# Altium footprint library microbuilder.PCBLIB: 422 footprints (part 16 of 27)
Each footprint in its own frame and in the unit in brackets; x right, y up, seen from the top. Pads: shape width x height; smd on the part's side, far side on the other; paste and mask are expansions set on the pad; w line width, h text height; cw(c..) or ccw(c..) is an arc to the next point about the centre after c.
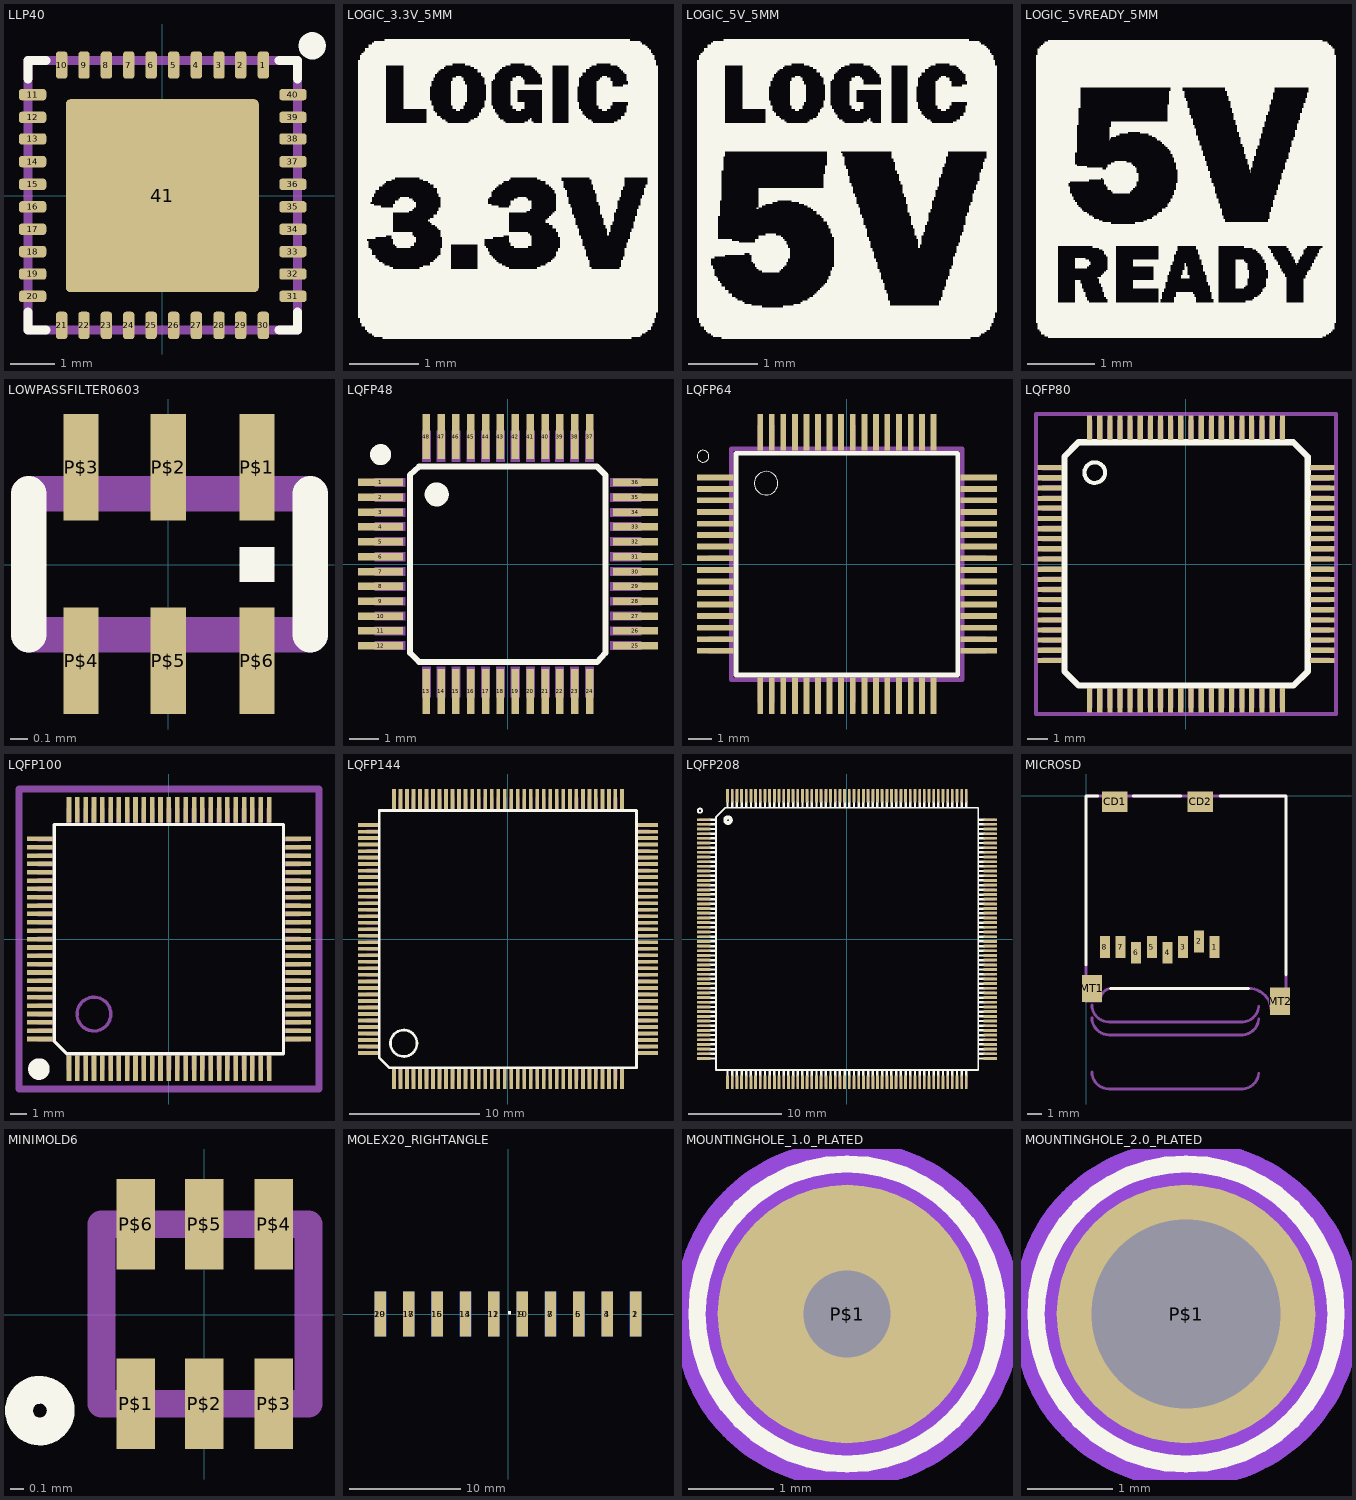
[diagram p15: the footprints below, top view; thin cyan lines are the x and y axes]

## LLP40 [mil]
pads (41):
  rrect50% 10x24 smd: 1(89,115) 2(69,115) 3(50,115) 4(30,115) 5(10,115) 6(-9.84,115) 7(-29.53,115) 8(-49.21,115) 9(-68.9,115) 10(-88.58,115) 21(-88.58,-114.17) 22(-68.9,-114.17) 23(-49.21,-114.17) 24(-29.53,-114.17) 25(-9.84,-114.17) 26(10,-114.17) 27(30,-114.17) 28(50,-114.17) 29(69,-114.17) 30(89,-114.17)
  rrect50% 24x10 smd: 11(-114.17,89) 12(-114.17,69) 13(-114.17,50) 14(-114.17,30) 15(-114.17,10) 16(-114.17,-9.84) 17(-114.17,-29.53) 18(-114.17,-49.21) 19(-114.17,-68.9) 20(-114.17,-88.58) 31(115,-88.58) 32(115,-68.9) 33(115,-49.21) 34(115,-29.53) 35(115,-9.84) 36(115,10) 37(115,30) 38(115,50) 39(115,69) 40(115,89)
  rrect5% 170x170 smd: 41(0,0)
Top Overlay:
  circle w12: c132,132 r6
  lines w8: -118.11,-102.36 -118.11,-118.11 -102.36,-118.11 ; -118.11,103 -118.11,119 -102.36,119 ; 103,-118.11 119,-118.11 119,-102.36 ; 103,119 119,119 119,103
Top Paste:
  rectangle: -78.74,40 -39.37,79
  rectangle: -19.68,40 20,79
  rectangle: 40,40 79,79
  rectangle: 40,-19.68 79,20
  rectangle: -19.68,-19.68 20,20
  rectangle: -78.74,-19.68 -39.37,20
  rectangle: -78.74,-78.74 -39.37,-39.37
  rectangle: -19.68,-78.74 20,-39.37
  rectangle: 40,-78.74 79,-39.37
Mechanical 16:
  lines w8: -118.11,-118.11 -118.11,119 119,119 119,-118.11 -118.11,-118.11

## LOGIC_3.3V_5MM [mil]
Top Overlay:
  drawing of 941 lines, arcs and shapes, not listed

## LOGIC_5V_5MM [mil]
Top Overlay:
  drawing of 975 lines, arcs and shapes, not listed

## LOGIC_5VREADY_5MM [mil]
Top Overlay:
  drawing of 1595 lines, arcs and shapes, not listed

## LOWPASSFILTER0603 [mil]
pads (6):
  rect 8x24 smd: P$1(20,22) P$2(0,22) P$3(-19.68,22) P$4(-19.68,-21.65) P$5(0,-21.65) P$6(20,-21.65)
Top Overlay:
  rectangle: 16,-3.94 24,4
  lines w8: -31.5,-15.75 -31.5,16 ; 32,-15.75 32,16
Mechanical 16:
  lines w5: -31.5,-15.75 -31.5,16 ; 32,-15.75 32,16
  lines w8: -31.5,-15.75 32,-15.75 ; -31.5,16 32,16

## LQFP48 [mil]
pads (48):
  rect 60x10 smd: 1(-169.29,109) 2(-169.29,89) 3(-169.29,69) 4(-169.29,50) 5(-169.29,30) 6(-169.29,10) 7(-169.29,-9.84) 8(-169.29,-29.53) 9(-169.29,-49.21) 10(-169.29,-68.9) 11(-169.29,-88.58) 12(-169.29,-108.27) 25(170,-108.27) 26(170,-88.58) 27(170,-68.9) 28(170,-49.21) 29(170,-29.53) 30(170,-9.84) 31(170,10) 32(170,30) 33(170,50) 34(170,69) 35(170,89) 36(170,109)
  rect 10x60 smd: 13(-108.27,-169.29) 14(-88.58,-169.29) 15(-68.9,-169.29) 16(-49.21,-169.29) 17(-29.53,-169.29) 18(-9.84,-169.29) 19(10,-169.29) 20(30,-169.29) 21(50,-169.29) 22(69,-169.29) 23(89,-169.29) 24(109,-169.29) 37(109,170) 38(89,170) 39(69,170) 40(50,170) 41(30,170) 42(10,170) 43(-9.84,170) 44(-29.53,170) 45(-49.21,170) 46(-68.9,170) 47(-88.58,170) 48(-108.27,170)
Top Overlay:
  circle w16: c-169.29,146 r6
  circle w16: c-94.49,93 r8
  lines w8: -129.92,-118.11 -129.92,119 -118.11,130 119,130 130,119 130,-118.11 119,-129.92 -118.11,-129.92 -129.92,-118.11
Mechanical 16:
  rectangle: -177.16,103 -135.83,115
  rectangle: -177.16,83 -135.83,95
  rectangle: -177.16,63 -135.83,75
  rectangle: -177.16,44 -135.83,56
  rectangle: -177.16,24 -135.83,36
  rectangle: -177.16,4 -135.83,16
  rectangle: -177.16,-15.75 -135.83,-3.93
  rectangle: -177.16,-35.44 -135.83,-23.62
  rectangle: -177.16,-55.12 -135.83,-43.3
  rectangle: -177.16,-74.81 -135.83,-62.99
  rectangle: -177.16,-94.49 -135.83,-82.67
  rectangle: -177.16,-114.18 -135.83,-102.36
  rectangle: -114.18,-177.16 -102.36,-135.83
  rectangle: -94.49,-177.16 -82.67,-135.83
  rectangle: -74.81,-177.16 -62.99,-135.83
  rectangle: -55.12,-177.16 -43.3,-135.83
  rectangle: -35.44,-177.16 -23.62,-135.83
  rectangle: -15.75,-177.16 -3.93,-135.83
  rectangle: 4,-177.16 16,-135.83
  rectangle: 24,-177.16 36,-135.83
  rectangle: 44,-177.16 56,-135.83
  rectangle: 63,-177.16 75,-135.83
  rectangle: 83,-177.16 95,-135.83
  rectangle: 103,-177.16 115,-135.83
  rectangle: 136,-114.18 178,-102.36
  rectangle: 136,-94.49 178,-82.67
  rectangle: 136,-74.81 178,-62.99
  rectangle: 136,-55.12 178,-43.3
  rectangle: 136,-35.44 178,-23.62
  rectangle: 136,-15.75 178,-3.93
  rectangle: 136,4 178,16
  rectangle: 136,24 178,36
  rectangle: 136,44 178,56
  rectangle: 136,63 178,75
  rectangle: 136,83 178,95
  rectangle: 136,103 178,115
  rectangle: 103,136 115,178
  rectangle: 83,136 95,178
  rectangle: 63,136 75,178
  rectangle: 44,136 56,178
  rectangle: 24,136 36,178
  rectangle: 4,136 16,178
  rectangle: -15.75,136 -3.93,178
  rectangle: -35.44,136 -23.62,178
  rectangle: -55.12,136 -43.3,178
  rectangle: -74.81,136 -62.99,178
  rectangle: -94.49,136 -82.67,178
  rectangle: -114.18,136 -102.36,178

## LQFP64 [mil]
pads (64):
  rect 62x10 smd: 1(-224.41,148) 2(-224.41,128) 3(-224.41,109) 4(-224.41,89) 5(-224.41,69) 6(-224.41,50) 7(-224.41,30) 8(-224.41,10) 9(-224.41,-9.84) 10(-224.41,-29.53) 11(-224.41,-49.21) 12(-224.41,-68.9) 13(-224.41,-88.58) 14(-224.41,-108.27) 15(-224.41,-127.95) 16(-224.41,-147.64) 33(225,-147.64) 34(225,-127.95) 35(225,-108.27) 36(225,-88.58) 37(225,-68.9) 38(225,-49.21) 39(225,-29.53) 40(225,-9.84) 41(225,10) 42(225,30) 43(225,50) 44(225,69) 45(225,89) 46(225,109) 47(225,128) 48(225,148)
  rect 10x62 smd: 17(-147.64,-224.41) 18(-127.95,-224.41) 19(-108.27,-224.41) 20(-88.58,-224.41) 21(-68.9,-224.41) 22(-49.21,-224.41) 23(-29.53,-224.41) 24(-9.84,-224.41) 25(10,-224.41) 26(30,-224.41) 27(50,-224.41) 28(69,-224.41) 29(89,-224.41) 30(109,-224.41) 31(128,-224.41) 32(148,-224.41) 49(148,225) 50(128,225) 51(109,225) 52(89,225) 53(69,225) 54(50,225) 55(30,225) 56(10,225) 57(-9.84,225) 58(-29.53,225) 59(-49.21,225) 60(-68.9,225) 61(-88.58,225) 62(-108.27,225) 63(-127.95,225) 64(-147.64,225)
Top Overlay:
  circle w0: c-245.08,184 r10
  circle w0: c-137.8,138 r20
  lines w8: -188.98,-188.98 -188.98,189 189,189 189,-188.98 -188.98,-188.98
Mechanical 16:
  rectangle: -236.22,144 -196.85,152
  rectangle: -236.22,124 -196.85,133
  rectangle: -236.22,104 -196.85,113
  rectangle: -236.22,85 -196.85,93
  rectangle: -236.22,65 -196.85,74
  rectangle: -236.22,45 -196.85,54
  rectangle: -236.22,26 -196.85,34
  rectangle: -236.22,6 -196.85,15
  rectangle: -236.22,-14.17 -196.85,-5.51
  rectangle: -236.22,-33.86 -196.85,-25.2
  rectangle: -236.22,-53.54 -196.85,-44.88
  rectangle: -236.22,-73.23 -196.85,-64.57
  rectangle: -236.22,-92.91 -196.85,-84.25
  rectangle: -236.22,-112.6 -196.85,-103.94
  rectangle: -236.22,-132.28 -196.85,-123.62
  rectangle: -236.22,-151.97 -196.85,-143.31
  rectangle: -151.97,-236.22 -143.31,-196.85
  rectangle: -132.28,-236.22 -123.62,-196.85
  rectangle: -112.6,-236.22 -103.94,-196.85
  rectangle: -92.91,-236.22 -84.25,-196.85
  rectangle: -73.23,-236.22 -64.57,-196.85
  rectangle: -53.54,-236.22 -44.88,-196.85
  rectangle: -33.86,-236.22 -25.2,-196.85
  rectangle: -14.17,-236.22 -5.51,-196.85
  rectangle: 6,-236.22 15,-196.85
  rectangle: 26,-236.22 34,-196.85
  rectangle: 45,-236.22 54,-196.85
  rectangle: 65,-236.22 74,-196.85
  rectangle: 85,-236.22 93,-196.85
  rectangle: 104,-236.22 113,-196.85
  rectangle: 124,-236.22 133,-196.85
  rectangle: 144,-236.22 152,-196.85
  rectangle: 197,-151.97 237,-143.31
  rectangle: 197,-132.28 237,-123.62
  rectangle: 197,-112.6 237,-103.94
  rectangle: 197,-92.91 237,-84.25
  rectangle: 197,-73.23 237,-64.57
  rectangle: 197,-53.54 237,-44.88
  rectangle: 197,-33.86 237,-25.2
  rectangle: 197,-14.17 237,-5.51
  rectangle: 197,6 237,15
  rectangle: 197,26 237,34
  rectangle: 197,45 237,54
  rectangle: 197,65 237,74
  rectangle: 197,85 237,93
  rectangle: 197,104 237,113
  rectangle: 197,124 237,133
  rectangle: 197,144 237,152
  rectangle: 144,197 152,237
  rectangle: 124,197 133,237
  rectangle: 104,197 113,237
  rectangle: 85,197 93,237
  rectangle: 65,197 74,237
  rectangle: 45,197 54,237
  rectangle: 26,197 34,237
  rectangle: 6,197 15,237
  rectangle: -14.17,197 -5.51,237
  rectangle: -33.86,197 -25.2,237
  rectangle: -53.54,197 -44.88,237
  rectangle: -73.23,197 -64.57,237
  rectangle: -92.91,197 -84.25,237
  rectangle: -112.6,197 -103.94,237
  rectangle: -132.28,197 -123.62,237
  rectangle: -151.97,197 -143.31,237
  lines w8: -196.85,-196.85 -196.85,197 197,197 197,-196.85 -196.85,-196.85

## LQFP80 [mil]
pads (80):
  rect 48x10 smd: 1(-264.76,188) 2(-264.76,168) 3(-264.76,148) 4(-264.76,128) 5(-264.76,109) 6(-264.76,89) 7(-264.76,69) 8(-264.76,50) 9(-264.76,30) 10(-264.76,10) 11(-264.76,-9.84) 12(-264.76,-29.53) 13(-264.76,-49.21) 14(-264.76,-68.9) 15(-264.76,-88.58) 16(-264.76,-108.27) 17(-264.76,-127.95) 18(-264.76,-147.64) 19(-264.76,-167.32) 20(-264.76,-187.01) 41(265,-187.01) 42(265,-167.32) 43(265,-147.64) 44(265,-127.95) 45(265,-108.27) 46(265,-88.58) 47(265,-68.9) 48(265,-49.21) 49(265,-29.53) 50(265,-9.84) 51(265,10) 52(265,30) 53(265,50) 54(265,69) 55(265,89) 56(265,109) 57(265,128) 58(265,148) 59(265,168) 60(265,188)
  rect 10x48 smd: 21(-187.01,-264.76) 22(-167.32,-264.76) 23(-147.64,-264.76) 24(-127.95,-264.76) 25(-108.27,-264.76) 26(-88.58,-264.76) 27(-68.9,-264.76) 28(-49.21,-264.76) 29(-29.53,-264.76) 30(-9.84,-264.76) 31(10,-264.76) 32(30,-264.76) 33(50,-264.76) 34(69,-264.76) 35(89,-264.76) 36(109,-264.76) 37(128,-264.76) 38(148,-264.76) 39(168,-264.76) 40(188,-264.76) 61(188,265) 62(168,265) 63(148,265) 64(128,265) 65(109,265) 66(89,265) 67(69,265) 68(50,265) 69(30,265) 70(10,265) 71(-9.84,265) 72(-29.53,265) 73(-49.21,265) 74(-68.9,265) 75(-88.58,265) 76(-108.27,265) 77(-127.95,265) 78(-147.64,265) 79(-167.32,265) 80(-187.01,265)
Top Overlay:
  circle w8: c-177.17,178 r20
  lines w12: -236.22,-208.66 -236.22,209 -208.66,237 209,237 237,209 237,-208.66 209,-236.22 -208.66,-236.22 -236.22,-208.66
Mechanical 16:
  region: 182,280 182,243 193,243 193,280
  region: 162.5,280.5 162.5,242.5 173.5,242.5 173.5,280.5
  region: 142.5,280.5 142.5,242.5 153.5,242.5 153.5,280.5
  region: 123,280 123,243 134,243 134,280
  region: 103,280 103,243 114,243 114,280
  region: 83.5,280.5 83.5,242.5 94.5,242.5 94.5,280.5
  region: 64,280 64,243 75,243 75,280
  region: 44,280 44,243 55,243 55,280
  region: 24.5,280.5 24.5,242.5 35.5,242.5 35.5,280.5
  region: 4.57,280.43 4.57,242.57 15.57,242.57 15.57,280.43
  region: -15.27,280.27 -15.27,242.73 -4.27,242.73 -4.27,280.27
  region: -35.03,280.2 -35.03,242.8 -24.03,242.8 -24.03,280.2
  region: -54.71,280.2 -54.71,242.8 -43.71,242.8 -43.71,280.2
  region: -74.4,280.2 -74.4,242.8 -63.4,242.8 -63.4,280.2
  region: -94.08,280.2 -94.08,242.8 -83.08,242.8 -83.08,280.2
  region: -113.77,280.2 -113.77,242.8 -102.77,242.8 -102.77,280.2
  region: -133.45,280.2 -133.45,242.8 -122.45,242.8 -122.45,280.2
  region: -153.14,280.2 -153.14,242.8 -142.14,242.8 -142.14,280.2
  region: -172.82,280.2 -172.82,242.8 -161.82,242.8 -161.82,280.2
  region: -192.51,280.2 -192.51,242.8 -181.51,242.8 -181.51,280.2
  rectangle: -279.52,182 -242.13,193
  rectangle: -279.52,162 -242.13,173
  rectangle: -279.52,143 -242.13,154
  rectangle: -279.52,123 -242.13,134
  rectangle: -279.52,103 -242.13,114
  rectangle: -279.52,84 -242.13,94
  rectangle: -279.52,64 -242.13,75
  rectangle: -279.52,44 -242.13,55
  rectangle: -279.52,25 -242.13,35
  rectangle: -279.52,5 -242.13,16
  rectangle: -279.52,-15.26 -242.13,-4.43
  rectangle: -279.52,-34.94 -242.13,-24.11
  rectangle: -279.52,-54.63 -242.13,-43.8
  rectangle: -279.52,-74.31 -242.13,-63.48
  rectangle: -279.52,-94 -242.13,-83.17
  rectangle: -279.52,-113.68 -242.13,-102.85
  rectangle: -279.52,-133.37 -242.13,-122.54
  rectangle: -279.52,-153.05 -242.13,-142.22
  rectangle: -279.52,-172.74 -242.13,-161.91
  rectangle: -279.52,-192.42 -242.13,-181.59
  region: -181.59,-279.52 -181.59,-242.13 -192.42,-242.13 -192.42,-279.52
  region: -161.91,-279.52 -161.91,-242.13 -172.73,-242.13 -172.73,-279.52
  region: -142.22,-279.52 -142.22,-242.13 -153.05,-242.13 -153.05,-279.52
  region: -122.54,-279.52 -122.54,-242.13 -133.36,-242.13 -133.36,-279.52
  region: -102.85,-279.52 -102.85,-242.13 -113.68,-242.13 -113.68,-279.52
  region: -83.17,-279.52 -83.17,-242.13 -93.99,-242.13 -93.99,-279.52
  region: -63.48,-279.52 -63.48,-242.13 -74.31,-242.13 -74.31,-279.52
  region: -43.8,-279.52 -43.8,-242.13 -54.62,-242.13 -54.62,-279.52
  region: -24.11,-279.52 -24.11,-242.13 -34.94,-242.13 -34.94,-279.52
  region: -4.35,-279.59 -4.35,-242.06 -15.18,-242.06 -15.18,-279.59
  region: 15.49,-279.75 15.49,-241.9 4.66,-241.9 4.66,-279.75
  region: 35.41,-279.82 35.41,-241.82 24.59,-241.82 24.59,-279.82
  region: 54.91,-279.32 54.91,-242.32 44.09,-242.32 44.09,-279.32
  region: 74.91,-279.32 74.91,-242.32 64.09,-242.32 64.09,-279.32
  region: 94.41,-279.82 94.41,-241.82 83.59,-241.82 83.59,-279.82
  region: 113.91,-279.32 113.91,-242.32 103.09,-242.32 103.09,-279.32
  region: 133.91,-279.32 133.91,-242.32 123.09,-242.32 123.09,-279.32
  region: 153.41,-279.82 153.41,-241.82 142.59,-241.82 142.59,-279.82
  region: 173.41,-279.82 173.41,-241.82 162.59,-241.82 162.59,-279.82
  region: 192.91,-279.32 192.91,-242.32 182.09,-242.32 182.09,-279.32
  region: 280,-181.59 243,-181.59 243,-192.42 280,-192.42
  region: 280,-161.91 243,-161.91 243,-172.73 280,-172.73
  region: 280,-142.22 243,-142.22 243,-153.05 280,-153.05
  region: 280,-122.54 243,-122.54 243,-133.36 280,-133.36
  region: 280,-102.85 243,-102.85 243,-113.68 280,-113.68
  region: 280,-83.17 243,-83.17 243,-93.99 280,-93.99
  region: 280,-63.48 243,-63.48 243,-74.31 280,-74.31
  region: 280,-43.8 243,-43.8 243,-54.62 280,-54.62
  region: 280,-24.11 243,-24.11 243,-34.94 280,-34.94
  region: 280,-4.43 243,-4.43 243,-15.25 280,-15.25
  region: 280,16 243,16 243,5 280,5
  region: 280,35 243,35 243,25 280,25
  region: 280,55 243,55 243,44 280,44
  region: 280,75 243,75 243,64 280,64
  region: 280,94 243,94 243,84 280,84
  region: 280,114 243,114 243,103 280,103
  region: 280,134 243,134 243,123 280,123
  region: 280,154 243,154 243,143 280,143
  region: 280,173 243,173 243,162 280,162
  region: 280,193 243,193 243,182 280,182
Mechanical 27:
  lines w8: -291.34,-291.34 -291.34,292 292,292 292,-291.34 -291.34,-291.34

## LQFP100 [mil]
pads (100):
  rect 11x60 smd: 1(-236.22,-305.12) 2(-216.54,-305.12) 3(-196.85,-305.12) 4(-177.17,-305.12) 5(-157.48,-305.12) 6(-137.8,-305.12) 7(-118.11,-305.12) 8(-98.43,-305.12) 9(-78.74,-305.12) 10(-59.06,-305.12) 11(-39.37,-305.12) 12(-19.68,-305.12) 13(0,-305.12) 14(20,-305.12) 15(40,-305.12) 16(60,-305.12) 17(79,-305.12) 18(99,-305.12) 19(119,-305.12) 20(138,-305.12) 21(158,-305.12) 22(178,-305.12) 23(197,-305.12) 24(217,-305.12) 25(237,-305.12) 51(237,306) 52(217,306) 53(197,306) 54(178,306) 55(158,306) 56(138,306) 57(119,306) 58(99,306) 59(79,306) 60(60,306) 61(40,306) 62(20,306) 63(0,306) 64(-19.68,306) 65(-39.37,306) 66(-59.06,306) 67(-78.74,306) 68(-98.43,306) 69(-118.11,306) 70(-137.8,306) 71(-157.48,306) 72(-177.17,306) 73(-196.85,306) 74(-216.54,306) 75(-236.22,306)
  rect 60x11 smd: 26(306,-236.22) 27(306,-216.54) 28(306,-196.85) 29(306,-177.17) 30(306,-157.48) 31(306,-137.8) 32(306,-118.11) 33(306,-98.43) 34(306,-78.74) 35(306,-59.06) 36(306,-39.37) 37(306,-19.68) 38(306,0) 39(306,20) 40(306,40) 41(306,60) 42(306,79) 43(306,99) 44(306,119) 45(306,138) 46(306,158) 47(306,178) 48(306,197) 49(306,217) 50(306,237) 76(-305.12,237) 77(-305.12,217) 78(-305.12,197) 79(-305.12,178) 80(-305.12,158) 81(-305.12,138) 82(-305.12,119) 83(-305.12,99) 84(-305.12,79) 85(-305.12,60) 86(-305.12,40) 87(-305.12,20) 88(-305.12,0) 89(-305.12,-19.68) 90(-305.12,-39.37) 91(-305.12,-59.06) 92(-305.12,-78.74) 93(-305.12,-98.43) 94(-305.12,-118.11) 95(-305.12,-137.8) 96(-305.12,-157.48) 97(-305.12,-177.17) 98(-305.12,-196.85) 99(-305.12,-216.54) 100(-305.12,-236.22)
Top Overlay:
  circle w25: c-307.17,-307.17 r13
  lines w8: -270.59,-241.06 -241.06,-270.59 271,-270.59 271,271 -270.59,271 -270.59,-241.06
Mechanical 16:
  circle w8: c-177.17,-177.17 r40
  rectangle: -241.54,271 -230.91,310
  rectangle: -221.85,271 -211.22,310
  rectangle: -202.17,271 -191.54,310
  rectangle: -182.48,271 -171.85,310
  rectangle: -162.8,271 -152.17,310
  rectangle: -143.11,271 -132.48,310
  rectangle: -123.43,271 -112.8,310
  rectangle: -103.74,271 -93.11,310
  rectangle: -84.06,271 -73.43,310
  rectangle: -64.37,271 -53.74,310
  rectangle: -44.69,271 -34.06,310
  rectangle: -25,271 -14.37,310
  rectangle: -5.32,271 6,310
  rectangle: 15,271 25,310
  rectangle: 35,271 45,310
  rectangle: 54,271 65,310
  rectangle: 74,271 85,310
  rectangle: 94,271 104,310
  rectangle: 113,271 124,310
  rectangle: 133,271 144,310
  rectangle: 153,271 163,310
  rectangle: 172,271 183,310
  rectangle: 192,271 203,310
  rectangle: 212,271 222,310
  rectangle: 231,271 242,310
  rectangle: 271,231 311,242
  rectangle: 271,212 311,222
  rectangle: 271,192 311,203
  rectangle: 271,172 311,183
  rectangle: 271,153 311,163
  rectangle: 271,133 311,144
  rectangle: 271,113 311,124
  rectangle: 271,94 311,104
  rectangle: 271,74 311,85
  rectangle: 271,54 311,65
  rectangle: 271,35 311,45
  rectangle: 271,15 311,25
  rectangle: 271,-5.32 311,6
  rectangle: 271,-25 311,-14.37
  rectangle: 271,-44.69 311,-34.06
  rectangle: 271,-64.37 311,-53.74
  rectangle: 271,-84.06 311,-73.43
  rectangle: 271,-103.74 311,-93.11
  rectangle: 271,-123.43 311,-112.8
  rectangle: 271,-143.11 311,-132.48
  rectangle: 271,-162.8 311,-152.17
  rectangle: 271,-182.48 311,-171.85
  rectangle: 271,-202.17 311,-191.54
  rectangle: 271,-221.85 311,-211.22
  rectangle: 271,-241.54 311,-230.91
  rectangle: 231,-309.96 242,-270.39
  rectangle: 212,-309.96 222,-270.39
  rectangle: 192,-309.96 203,-270.39
  rectangle: 172,-309.96 183,-270.39
  rectangle: 153,-309.96 163,-270.39
  rectangle: 133,-309.96 144,-270.39
  rectangle: 113,-309.96 124,-270.39
  rectangle: 94,-309.96 104,-270.39
  rectangle: 74,-309.96 85,-270.39
  rectangle: 54,-309.96 65,-270.39
  rectangle: 35,-309.96 45,-270.39
  rectangle: 15,-309.96 25,-270.39
  rectangle: -5.32,-309.96 6,-270.39
  rectangle: -25,-309.96 -14.37,-270.39
  rectangle: -44.69,-309.96 -34.06,-270.39
  rectangle: -64.37,-309.96 -53.74,-270.39
  rectangle: -84.06,-309.96 -73.43,-270.39
  rectangle: -103.74,-309.96 -93.11,-270.39
  rectangle: -123.43,-309.96 -112.8,-270.39
  rectangle: -143.11,-309.96 -132.48,-270.39
  rectangle: -162.8,-309.96 -152.17,-270.39
  rectangle: -182.48,-309.96 -171.85,-270.39
  rectangle: -202.17,-309.96 -191.54,-270.39
  rectangle: -221.85,-309.96 -211.22,-270.39
  rectangle: -241.54,-309.96 -230.91,-270.39
  rectangle: -310.16,-241.54 -270.59,-230.91
  rectangle: -310.16,-221.85 -270.59,-211.22
  rectangle: -310.16,-202.17 -270.59,-191.54
  rectangle: -310.16,-182.48 -270.59,-171.85
  rectangle: -310.16,-162.8 -270.59,-152.17
  rectangle: -310.16,-143.11 -270.59,-132.48
  rectangle: -310.16,-123.43 -270.59,-112.8
  rectangle: -310.16,-103.74 -270.59,-93.11
  rectangle: -310.16,-84.06 -270.59,-73.43
  rectangle: -310.16,-64.37 -270.59,-53.74
  rectangle: -310.16,-44.69 -270.59,-34.06
  rectangle: -310.16,-25 -270.59,-14.37
  rectangle: -310.16,-5.32 -270.59,6
  rectangle: -310.16,15 -270.59,25
  rectangle: -310.16,35 -270.59,45
  rectangle: -310.16,54 -270.59,65
  rectangle: -310.16,74 -270.59,85
  rectangle: -310.16,94 -270.59,104
  rectangle: -310.16,113 -270.59,124
  rectangle: -310.16,133 -270.59,144
  rectangle: -310.16,153 -270.59,163
  rectangle: -310.16,172 -270.59,183
  rectangle: -310.16,192 -270.59,203
  rectangle: -310.16,212 -270.59,222
  rectangle: -310.16,231 -270.59,242
Mechanical 27:
  lines w16: -354.33,-354.33 355,-354.33 355,355 -354.33,355 -354.33,-354.33

## LQFP144 [mil]
pads (144):
  rect 11x60 smd: 1(-344.49,-423.23) 2(-324.8,-423.23) 3(-305.12,-423.23) 4(-285.43,-423.23) 5(-265.75,-423.23) 6(-246.06,-423.23) 7(-226.38,-423.23) 8(-206.69,-423.23) 9(-187.01,-423.23) 10(-167.32,-423.23) 11(-147.64,-423.23) 12(-127.95,-423.23) 13(-108.27,-423.23) 14(-88.58,-423.23) 15(-68.9,-423.23) 16(-49.21,-423.23) 17(-29.53,-423.23) 18(-9.84,-423.23) 19(10,-423.23) 20(30,-423.23) 21(50,-423.23) 22(69,-423.23) 23(89,-423.23) 24(109,-423.23) 25(128,-423.23) 26(148,-423.23) 27(168,-423.23) 28(188,-423.23) 29(207,-423.23) 30(227,-423.23) 31(247,-423.23) 32(266,-423.23) 33(286,-423.23) 34(306,-423.23) 35(325,-423.23) 36(345,-423.23) 73(345,424) 74(325,424) 75(306,424) 76(286,424) 77(266,424) 78(247,424) 79(227,424) 80(207,424) 81(188,424) 82(168,424) 83(148,424) 84(128,424) 85(109,424) 86(89,424) 87(69,424) 88(50,424) 89(30,424) 90(10,424) 91(-9.84,424) 92(-29.53,424) 93(-49.21,424) 94(-68.9,424) 95(-88.58,424) 96(-108.27,424) 97(-127.95,424) 98(-147.64,424) 99(-167.32,424) 100(-187.01,424) 101(-206.69,424) 102(-226.38,424) 103(-246.06,424) 104(-265.75,424) 105(-285.43,424) 106(-305.12,424) 107(-324.8,424) 108(-344.49,424)
  rect 60x11 smd: 37(424,-344.49) 38(424,-324.8) 39(424,-305.12) 40(424,-285.43) 41(424,-265.75) 42(424,-246.06) 43(424,-226.38) 44(424,-206.69) 45(424,-187.01) 46(424,-167.32) 47(424,-147.64) 48(424,-127.95) 49(424,-108.27) 50(424,-88.58) 51(424,-68.9) 52(424,-49.21) 53(424,-29.53) 54(424,-9.84) 55(424,10) 56(424,30) 57(424,50) 58(424,69) 59(424,89) 60(424,109) 61(424,128) 62(424,148) 63(424,168) 64(424,188) 65(424,207) 66(424,227) 67(424,247) 68(424,266) 69(424,286) 70(424,306) 71(424,325) 72(424,345) 109(-423.23,345) 110(-423.23,325) 111(-423.23,306) 112(-423.23,286) 113(-423.23,266) 114(-423.23,247) 115(-423.23,227) 116(-423.23,207) 117(-423.23,188) 118(-423.23,168) 119(-423.23,148) 120(-423.23,128) 121(-423.23,109) 122(-423.23,89) 123(-423.23,69) 124(-423.23,50) 125(-423.23,30) 126(-423.23,10) 127(-423.23,-9.84) 128(-423.23,-29.53) 129(-423.23,-49.21) 130(-423.23,-68.9) 131(-423.23,-88.58) 132(-423.23,-108.27) 133(-423.23,-127.95) 134(-423.23,-147.64) 135(-423.23,-167.32) 136(-423.23,-187.01) 137(-423.23,-206.69) 138(-423.23,-226.38) 139(-423.23,-246.06) 140(-423.23,-265.75) 141(-423.23,-285.43) 142(-423.23,-305.12) 143(-423.23,-324.8) 144(-423.23,-344.49)
Top Overlay:
  circle w8: c-314.96,-314.96 r40
  lines w8: -388.7,-359.17 -359.17,-388.7 389,-388.7 389,389 -388.7,389 -388.7,-359.17
Mechanical 16:
  rectangle: -349.8,389 -339.17,429
  rectangle: -330.12,389 -319.49,429
  rectangle: -310.43,389 -299.8,429
  rectangle: -290.75,389 -280.12,429
  rectangle: -271.06,389 -260.43,429
  rectangle: -251.38,389 -240.75,429
  rectangle: -231.69,389 -221.06,429
  rectangle: -212.01,389 -201.38,429
  rectangle: -192.32,389 -181.69,429
  rectangle: -172.64,389 -162.01,429
  rectangle: -152.95,389 -142.32,429
  rectangle: -133.27,389 -122.64,429
  rectangle: -113.58,389 -102.95,429
  rectangle: -93.9,389 -83.27,429
  rectangle: -74.21,389 -63.58,429
  rectangle: -54.53,389 -43.9,429
  rectangle: -34.84,389 -24.21,429
  rectangle: -15.16,389 -4.53,429
  rectangle: 5,389 16,429
  rectangle: 25,389 35,429
  rectangle: 44,389 55,429
  rectangle: 64,389 75,429
  rectangle: 84,389 94,429
  rectangle: 103,389 114,429
  rectangle: 123,389 134,429
  rectangle: 143,389 153,429
  rectangle: 163,389 173,429
  rectangle: 182,389 193,429
  rectangle: 202,389 213,429
  rectangle: 222,389 232,429
  rectangle: 241,389 252,429
  rectangle: 261,389 272,429
  rectangle: 281,389 291,429
  rectangle: 300,389 311,429
  rectangle: 320,389 331,429
  rectangle: 340,389 350,429
  rectangle: -349.8,-428.17 -339.17,-388.7
  rectangle: -330.12,-428.17 -319.49,-388.7
  rectangle: -310.43,-428.17 -299.8,-388.7
  rectangle: -290.75,-428.17 -280.12,-388.7
  rectangle: -271.06,-428.17 -260.43,-388.7
  rectangle: -251.38,-428.17 -240.75,-388.7
  rectangle: -231.69,-428.17 -221.06,-388.7
  rectangle: -212.01,-428.17 -201.38,-388.7
  rectangle: -192.32,-428.17 -181.69,-388.7
  rectangle: -172.64,-428.17 -162.01,-388.7
  rectangle: -152.95,-428.17 -142.32,-388.7
  rectangle: -133.27,-428.17 -122.64,-388.7
  rectangle: -113.58,-428.17 -102.95,-388.7
  rectangle: -93.9,-428.17 -83.27,-388.7
  rectangle: -74.21,-428.17 -63.58,-388.7
  rectangle: -54.53,-428.17 -43.9,-388.7
  rectangle: -34.84,-428.17 -24.21,-388.7
  rectangle: -15.16,-428.17 -4.53,-388.7
  rectangle: 5,-428.17 16,-388.7
  rectangle: 25,-428.17 35,-388.7
  rectangle: 44,-428.17 55,-388.7
  rectangle: 64,-428.17 75,-388.7
  rectangle: 84,-428.17 94,-388.7
  rectangle: 103,-428.17 114,-388.7
  rectangle: 123,-428.17 134,-388.7
  rectangle: 143,-428.17 153,-388.7
  rectangle: 163,-428.17 173,-388.7
  rectangle: 182,-428.17 193,-388.7
  rectangle: 202,-428.17 213,-388.7
  rectangle: 222,-428.17 232,-388.7
  rectangle: 241,-428.17 252,-388.7
  rectangle: 261,-428.17 272,-388.7
  rectangle: 281,-428.17 291,-388.7
  rectangle: 300,-428.17 311,-388.7
  rectangle: 320,-428.17 331,-388.7
  rectangle: 340,-428.17 350,-388.7
  rectangle: 389,-349.8 429,-339.17
  rectangle: 389,-330.12 429,-319.49
  rectangle: 389,-310.43 429,-299.8
  rectangle: 389,-290.75 429,-280.12
  rectangle: 389,-271.06 429,-260.43
  rectangle: 389,-251.38 429,-240.75
  rectangle: 389,-231.69 429,-221.06
  rectangle: 389,-212.01 429,-201.38
  rectangle: 389,-192.32 429,-181.69
  rectangle: 389,-172.64 429,-162.01
  rectangle: 389,-152.95 429,-142.32
  rectangle: 389,-133.27 429,-122.64
  rectangle: 389,-113.58 429,-102.95
  rectangle: 389,-93.9 429,-83.27
  rectangle: 389,-74.21 429,-63.58
  rectangle: 389,-54.53 429,-43.9
  rectangle: 389,-34.84 429,-24.21
  rectangle: 389,-15.16 429,-4.53
  rectangle: 389,5 429,16
  rectangle: 389,25 429,35
  rectangle: 389,44 429,55
  rectangle: 389,64 429,75
  rectangle: 389,84 429,94
  rectangle: 389,103 429,114
  rectangle: 389,123 429,134
  rectangle: 389,143 429,153
  rectangle: 389,163 429,173
  rectangle: 389,182 429,193
  rectangle: 389,202 429,213
  rectangle: 389,222 429,232
  rectangle: 389,241 429,252
  rectangle: 389,261 429,272
  rectangle: 389,281 429,291
  rectangle: 389,300 429,311
  rectangle: 389,320 429,331
  rectangle: 389,340 429,350
  rectangle: -428.07,-349.8 -388.6,-339.17
  rectangle: -428.07,-330.12 -388.6,-319.49
  rectangle: -428.07,-310.43 -388.6,-299.8
  rectangle: -428.07,-290.75 -388.6,-280.12
  rectangle: -428.07,-271.06 -388.6,-260.43
  rectangle: -428.07,-251.38 -388.6,-240.75
  rectangle: -428.07,-231.69 -388.6,-221.06
  rectangle: -428.07,-212.01 -388.6,-201.38
  rectangle: -428.07,-192.32 -388.6,-181.69
  rectangle: -428.07,-172.64 -388.6,-162.01
  rectangle: -428.07,-152.95 -388.6,-142.32
  rectangle: -428.07,-133.27 -388.6,-122.64
  rectangle: -428.07,-113.58 -388.6,-102.95
  rectangle: -428.07,-93.9 -388.6,-83.27
  rectangle: -428.07,-74.21 -388.6,-63.58
  rectangle: -428.07,-54.53 -388.6,-43.9
  rectangle: -428.07,-34.84 -388.6,-24.21
  rectangle: -428.07,-15.16 -388.6,-4.53
  rectangle: -428.07,5 -388.6,16
  rectangle: -428.07,25 -388.6,35
  rectangle: -428.07,44 -388.6,55
  rectangle: -428.07,64 -388.6,75
  rectangle: -428.07,84 -388.6,94
  rectangle: -428.07,103 -388.6,114
  rectangle: -428.07,123 -388.6,134
  rectangle: -428.07,143 -388.6,153
  rectangle: -428.07,163 -388.6,173
  rectangle: -428.07,182 -388.6,193
  rectangle: -428.07,202 -388.6,213
  rectangle: -428.07,222 -388.6,232
  rectangle: -428.07,241 -388.6,252
  rectangle: -428.07,261 -388.6,272
  rectangle: -428.07,281 -388.6,291
  rectangle: -428.07,300 -388.6,311
  rectangle: -428.07,320 -388.6,331
  rectangle: -428.07,340 -388.6,350

## LQFP208 [mil]
pads (208):
  rect 56x12 smd: 1(-602.36,502) 2(-602.36,483) 3(-602.36,463) 4(-602.36,443) 5(-602.36,424) 6(-602.36,404) 7(-602.36,384) 8(-602.36,365) 9(-602.36,345) 10(-602.36,325) 11(-602.36,306) 12(-602.36,286) 13(-602.36,266) 14(-602.36,247) 15(-602.36,227) 16(-602.36,207) 17(-602.36,188) 18(-602.36,168) 19(-602.36,148) 20(-602.36,128) 21(-602.36,109) 22(-602.36,89) 23(-602.36,69) 24(-602.36,50) 25(-602.36,30) 26(-602.36,10) 27(-602.36,-9.84) 28(-602.36,-29.53) 29(-602.36,-49.21) 30(-602.36,-68.9) 31(-602.36,-88.58) 32(-602.36,-108.27) 33(-602.36,-127.95) 34(-602.36,-147.64) 35(-602.36,-167.32) 36(-602.36,-187.01) 37(-602.36,-206.69) 38(-602.36,-226.38) 39(-602.36,-246.06) 40(-602.36,-265.75) 41(-602.36,-285.43) 42(-602.36,-305.12) 43(-602.36,-324.8) 44(-602.36,-344.49) 45(-602.36,-364.17) 46(-602.36,-383.86) 47(-602.36,-403.54) 48(-602.36,-423.23) 49(-602.36,-442.91) 50(-602.36,-462.6) 51(-602.36,-482.28) 52(-602.36,-501.97) 105(603,-501.97) 106(603,-482.28) 107(603,-462.6) 108(603,-442.91) 109(603,-423.23) 110(603,-403.54) 111(603,-383.86) 112(603,-364.17) 113(603,-344.49) 114(603,-324.8) 115(603,-305.12) 116(603,-285.43) 117(603,-265.75) 118(603,-246.06) 119(603,-226.38) 120(603,-206.69) 121(603,-187.01) 122(603,-167.32) 123(603,-147.64) 124(603,-127.95) 125(603,-108.27) 126(603,-88.58) 127(603,-68.9) 128(603,-49.21) 129(603,-29.53) 130(603,-9.84) 131(603,10) 132(603,30) 133(603,50) 134(603,69) 135(603,89) 136(603,109) 137(603,128) 138(603,148) 139(603,168) 140(603,188) 141(603,207) 142(603,227) 143(603,247) 144(603,266) 145(603,286) 146(603,306) 147(603,325) 148(603,345) 149(603,365) 150(603,384) 151(603,404) 152(603,424) 153(603,443) 154(603,463) 155(603,483) 156(603,502)
  rect 12x56 smd: 53(-501.97,-602.36) 54(-482.28,-602.36) 55(-462.6,-602.36) 56(-442.91,-602.36) 57(-423.23,-602.36) 58(-403.54,-602.36) 59(-383.86,-602.36) 60(-364.17,-602.36) 61(-344.49,-602.36) 62(-324.8,-602.36) 63(-305.12,-602.36) 64(-285.43,-602.36) 65(-265.75,-602.36) 66(-246.06,-602.36) 67(-226.38,-602.36) 68(-206.69,-602.36) 69(-187.01,-602.36) 70(-167.32,-602.36) 71(-147.64,-602.36) 72(-127.95,-602.36) 73(-108.27,-602.36) 74(-88.58,-602.36) 75(-68.9,-602.36) 76(-49.21,-602.36) 77(-29.53,-602.36) 78(-9.84,-602.36) 79(10,-602.36) 80(30,-602.36) 81(50,-602.36) 82(69,-602.36) 83(89,-602.36) 84(109,-602.36) 85(128,-602.36) 86(148,-602.36) 87(168,-602.36) 88(188,-602.36) 89(207,-602.36) 90(227,-602.36) 91(247,-602.36) 92(266,-602.36) 93(286,-602.36) 94(306,-602.36) 95(325,-602.36) 96(345,-602.36) 97(365,-602.36) 98(384,-602.36) 99(404,-602.36) 100(424,-602.36) 101(443,-602.36) 102(463,-602.36) 103(483,-602.36) 104(502,-602.36) 157(502,603) 158(483,603) 159(463,603) 160(443,603) 161(424,603) 162(404,603) 163(384,603) 164(365,603) 165(345,603) 166(325,603) 167(306,603) 168(286,603) 169(266,603) 170(247,603) 171(227,603) 172(207,603) 173(188,603) 174(168,603) 175(148,603) 176(128,603) 177(109,603) 178(89,603) 179(69,603) 180(50,603) 181(30,603) 182(10,603) 183(-9.84,603) 184(-29.53,603) 185(-49.21,603) 186(-68.9,603) 187(-88.58,603) 188(-108.27,603) 189(-127.95,603) 190(-147.64,603) 191(-167.32,603) 192(-187.01,603) 193(-206.69,603) 194(-226.38,603) 195(-246.06,603) 196(-265.75,603) 197(-285.43,603) 198(-305.12,603) 199(-324.8,603) 200(-344.49,603) 201(-364.17,603) 202(-383.86,603) 203(-403.54,603) 204(-423.23,603) 205(-442.91,603) 206(-462.6,603) 207(-482.28,603) 208(-501.97,603)
Top Overlay:
  drawing of 215 lines, arcs and shapes, not listed
Mechanical 16:
  drawing of 208 lines, arcs and shapes, not listed

## MICROSD [mil]
pads (12):
  rect 28x60 smd: 1(355,-418.9) 2(312,-403.15) 3(268,-418.9) 4(225,-434.65) 5(182,-418.9) 6(138,-434.65) 7(95,-418.9) 8(52,-418.9)
  rect 71x56 smd: CD1(79,-17.32) CD2(315,-17.32)
  rect 56x75 smd: MT1(16,-533.07) MT2(536,-568.5)
Top Overlay:
  lines w8: 0,-468.5 0,-1.57 32,-1.57 ; 67,-533.07 449,-533.07 ; 130,-1.57 262,-1.57 ; 370,-1.57 552,-1.57 552,-496.06
Mechanical 16:
  lines w8: 0,-470 0,-568.5 40,-568.5 cw(c71.22,-564.29) 67,-533.07 ; 0,-1.57 552,-1.57 ; 16,-763.78 ccw(c63.12,-763.9) 63,-811.02 426,-811.02 ccw(c429.85,-763.87) 477,-767.72 ; 16,-614.17 ccw(c63.12,-614.3) 63,-661.42 426,-661.42 ccw(c429.85,-614.26) 477,-618.11 ; 16,-578.74 ccw(c63.12,-578.86) 63,-625.98 426,-625.98 ccw(c429.85,-578.83) 477,-582.68 ; 449,-533.07 cw(c449,-596.07) 512,-596.06 552,-596.06 552,-500

## MINIMOLD6 [mil]
pads (6):
  rect 11x26 smd: P$1(-19.68,-25.59) P$2(0,-25.59) P$3(20,-25.59) P$4(20,26) P$5(0,26) P$6(-19.68,26)
Top Overlay:
  circle w8: c-47.24,-27.56 r6
Mechanical 16:
  lines w8: -29.53,-25.59 30,-25.59 30,26 -29.53,26 -29.53,-25.59

## MOLEX20_RIGHTANGLE [mil]
pads (20):
  rect 40x158 smd: 1(450,0) 3(350,0) 5(250,0) 7(150,0) 9(50,0) 11(-50,0) 13(-150,0) 15(-250,0) 17(-350,0) 19(-450,0)
  rect 40x158 smd far side: 2(450,0) 4(350,0) 6(250,0) 8(150,0) 10(50,0) 12(-50,0) 14(-150,0) 16(-250,0) 18(-350,0) 20(-450,0)
Top Overlay:
  region: 0,0 10,0 10,10 0,10
Mechanical 16:
  text "19" at -475,100 h49.6
  text "17" at -375,100 h49.6
  text "15" at -275,100 h49.6
  text "13" at -175,100 h49.6
  text "11" at -75,100 h49.6
  text "9" at 38,100 h49.6
  text "7" at 138,100 h49.6
  text "5" at 238,100 h49.6
  text "3" at 338,100 h49.6
  text "1" at 438,100 h49.6
Mechanical 30:
  text "20" at -425,-137.5 h49.6
  text "18" at -325,-137.5 h49.6
  text "16" at -225,-137.5 h49.6
  text "14" at -125,-137.5 h49.6
  text "12" at -25,-137.5 h49.6
  text "10" at 75,-137.5 h49.6
  text "8" at 163,-137.5 h49.6
  text "6" at 263,-137.5 h49.6
  text "4" at 363,-137.5 h49.6
  text "2" at 463,-137.5 h49.6

## MOUNTINGHOLE_1.0_PLATED [mil]
pads (1):
  round 119 hole 40: P$1(0,0)
Top Layer keep-out:
  circle w80: c0,0 r40
Bottom Layer keep-out:
  circle w80: c0,0 r40
Top Overlay:
  circle w8: c0,0 r69
Mechanical 13:
  text "1,0" at -34.25,-107.87 h49.6
Via Holes:
  circle w80: c0,0 r40
Mechanical 27:
  circle w80: c0,0 r40
Mechanical 28:
  circle w80: c0,0 r40

## MOUNTINGHOLE_2.0_PLATED [mil]
pads (1):
  round 119 hole 87: P$1(0,0)
Top Layer keep-out:
  circle w80: c0,0 r40
Bottom Layer keep-out:
  circle w80: c0,0 r40
Top Overlay:
  circle w8: c0,0 r69
Mechanical 13:
  text "2,0" at -34.25,-107.87 h49.6
Via Holes:
  circle w80: c0,0 r40
Mechanical 27:
  circle w80: c0,0 r40
Mechanical 28:
  circle w80: c0,0 r40